# Altium integrated library Cap-General-THP_V2.IntLib: 122 symbols (continued)
## 0.47uF-275VAC-20%-ECQU2A474ML
designator C?, comment value 0.47uF  Voltage: 275VAC  (hidden comment: ECQU2A474ML)
Cap Metallized Polypropylene - Interference Suppressor; Manufacturer: Panasonic; Tol: 20%; Part Number: ECQU2A474ML; Package: POLY-26.5x8.5x17.5-22.5P-BL; EDM-PN: *; Text2: *; Text1: *
footprint POLY-26.5x8.5x17.5-22.5P-BL (Cap- Poly 26.5x8.5mm 22.5 Pitch)
pins: 1, 2

## 0.047uF-275VAC-20%-PHE820MB5470MR17
designator C?, comment value 0.047uF  Voltage: 275VAC  (hidden comment: PHE820MB5470MR17)
Cap Metallized Polyester; Manufacturer: Kemet; Tol: 20%; Part Number: PHE820MB5470MR17; Package: Poly-18x6.5x12.5-15P-BLUE; EDM-PN: *; Text2: *; Text1: *
footprint Poly-18x6.5x12.5-15P-BLUE (Cap Poly  18x6.5-12.5mm 15mm Pitch)
pins: 1, 2

## 0.47uF-310V-10%-0.47 310/275 18.0 16.0 10.0 15.0 0.8
designator C?, comment value 0.47uF  Voltage: 310V  (hidden comment: 0.47 310/275 18.0 16.0 10.0 15.0 0.8)
Cap Metallized Polypropylene - X2; Manufacturer: Jenn Fu; Tol: 10%; Part Number: 0.47 310/275 18.0 16.0 10.0 15.0 0.8; Package: Poly-18x10x16-15P-YEL; EDM-PN: *; Text2: *; Text1: *
footprint Poly-18x10x16-15P-YEL (Cap Poly  18x10mm 15mm Pitch)
pins: 1, 2

## 0.47uF-310V-10%-0.47 310/275 18.0 16.0 10.0 15.0 0.8-Rt-SMD-05
designator C?, comment value 0.47uF  Voltage: 310V  (hidden comment: 0.47 310/275 18.0 16.0 10.0 15.0 0.8)
Cap Metallized Polypropylene - X2; Manufacturer: Jenn Fu; Tol: 10%; Part Number: 0.47 310/275 18.0 16.0 10.0 15.0 0.8; Package: Poly-18x10x16-15P-YEL-RT-05; EDM-PN: *; Text2: *; Text1: *
footprint Poly-18x10x16-15P-YEL-RT-05 (Cap Poly  18x10-16mm 15mm Pitch)
pins: 1, 2

## 0.47uF-310V-10%-890334025039CS
designator C?, comment value 0.47uF  Voltage: 310V  (hidden comment: 890334025039CS)
Cap Metallized Polypropylene - X2; Manufacturer: Wurth; Tol: 10%; Part Number: 890334025039CS; Package: Poly-18x8x15-15P-RED-WE; EDM-PN: *; Text2: *; Text1: *
footprint Poly-18x8x15-15P-RED-WE (Cap Poly  18x5-15mm 15mm Pitch)
pins: 1, 2

## 0.47uF-310V-10%-890334025039CS-Rt-SMD-05
designator C?, comment value 0.47uF  Voltage: 310V  (hidden comment: 890334025039CS)
Cap Metallized Polypropylene - X2; Manufacturer: Wurth; Tol: 10%; Part Number: 890334025039CS; Package: Poly-18x8x15-15P-RED-WE-RT-05; EDM-PN: *; Text2: *; Text1: *
footprint Poly-18x8x15-15P-RED-WE-RT-05 (Cap Poly  18x5-15mm 15mm Pitch)
pins: 1, 2

## 0.47uF-310V-10%-MPX474KF1
designator C?, comment value 0.47uF  Voltage: 310V  (hidden comment: MPX474KF1)
Cap Metallized Polypropylene - X2; Manufacturer: Jenn-Fu; Tol: 10%; Part Number: MPX474KF1; Package: Poly-31.5x11x21-27.5P-Yell; EDM-PN: *; Text2: *; Text1: *
footprint Poly-31.5x11x21-27.5P-Yell (Cap - Poly  31.5x11.0mm)
pins: 1, 2

## 0.47uF-310V-10%-MPX474KF1-Rt
designator C?, comment value 0.47uF  Voltage: 310V  (hidden comment: MPX474KF1)
Cap Metallized Polypropylene - X2; Manufacturer: Jenn-Fu; Tol: 10%; Part Number: MPX474KF1; Package: Poly-31.5x11x21-27.5P-Yell-RT; EDM-PN: *; Text2: *; Text1: *
footprint Poly-31.5x11x21-27.5P-Yell-RT (Cap - Poly  31.5x11.0mm)
pins: 1, 2

## 0.47uF-310V-10%-MPX474KF1-Rt-SMD-3
designator C?, comment value 0.47uF  Voltage: 310V  (hidden comment: MPX474KF1)
Cap Metallized Polypropylene - X2; Manufacturer: Jenn-Fu; Tol: 10%; Part Number: MPX474KF1; Package: Poly-31.5x11x21-27.5P-Yell-RT-SMD-3; EDM-PN: *; Text2: *; Text1: *
footprint Poly-31.5x11x21-27.5P-Yell-RT-SMD-3 (Cap - Poly  31.5x11.0mm)
pins: 1, 2

## 0.47uF-310V-10%-MPX474KF1-Rt-SMD-05
designator C?, comment value 0.47uF  Voltage: 310V  (hidden comment: MPX474KF1)
Cap Metallized Polypropylene - X2; Manufacturer: Jenn-Fu; Tol: 10%; Part Number: MPX474KF1; Package: Poly-31.5x11x21-27.5P-Yell-RT-SMD-05; EDM-PN: *; Text2: *; Text1: *
footprint Poly-31.5x11x21-27.5P-Yell-RT-SMD-05 (Cap - Poly  31.5x11.0mm)
pins: 1, 2

## 0.047uF-630V-10%-MKS2J024701K00
designator C?, comment value 0.047uF  Voltage: 630V  (hidden comment: MKS2J024701K00)
Cap Metallized Polyester; Manufacturer: Wima; Tol: 10%; Part Number: MKS2J024701K00; Package: MKS2-8.5x7.2x14-5; EDM-PN: *; Text2: *; Text1: *
footprint MKS2-8.5x7.2x14-5 (MKS2 8.5x7.2mm 14mm PCM 5.0)
pins: 1, 2

## 0.047uF-630V-10%-MKS2J024701K00-RT
designator C?, comment value 0.047uF  Voltage: 630V  (hidden comment: MKS2J024701K00)
Cap Metallized Polyester; Manufacturer: Wima; Tol: 10%; Part Number: MKS2J024701K00; Package: MKS2-8.5x7.2x14-5-RT; EDM-PN: *; Text2: *; Text1: *
footprint MKS2-8.5x7.2x14-5-RT (MKS2 8.5x7.2mm 14mm PCM 5.0)
pins: 1, 2

## 0.47uF-630V-10%-TS02 00 2J474KSA0IVF
designator C?, comment value 0.47uF  Voltage: 630V  (hidden comment: TS02 00 2J474KSA0IVF)
Cap Metallized Polyester; Manufacturer: Suntan; Tol: 10%; Part Number: TS02 00 2J474KSA0IVF; Package: TS02-31x8x15.5-27.5P; EDM-PN: *; Text2: *; Text1: *
footprint TS02-31x8x15.5-27.5P (TS02 31x8x15.5mm 27.5P)
pins: 1, 2

## 0.47uF-630V-10%-TS02 00 2J474KSA0IVF-DNF
designator C?, comment value (0.47uF)  Voltage: 630V  (hidden comment: TS02 00 2J474KSA0IVF)
Cap Metallized Polyester - Do not Fit; Manufacturer: Suntan; Part Number: DNF - TS02 00 2J474KSA0IVF; Tol: 10%; Package: TS02-31x8x15.5-27.5P; EDM-PN: *; Text2: *; Text1: *
footprint TS02-31x8x15.5-27.5P (TS02 31x8x15.5mm 27.5P)
pins: 1, 2

## 0.47uF-630V-10%-TS02 00 2J474KSA0IVF-DNF-Rt
designator C?, comment value (0.47uF)  Voltage: 630V  (hidden comment: TS02 00 2J474KSA0IVF)
Cap Metallized Polyester - Do not Fit; Manufacturer: Suntan; Part Number: DNF - TS02 00 2J474KSA0IVF; Tol: 10%; Package: TS02-31x8x15.5-27.5P-Rt; EDM-PN: *; Text2: *; Text1: *
footprint TS02-31x8x15.5-27.5P-Rt (TS02 31x8x15.5mm 27.5P)
pins: 1, 2

## 0.47uF-630V-10%-TS02 00 2J474KSA0IVF-Rt
designator C?, comment value 0.47uF  Voltage: 630V  (hidden comment: TS02 00 2J474KSA0IVF)
Cap Metallized Polyester; Manufacturer: Suntan; Tol: 10%; Part Number: TS02 00 2J474KSA0IVF; Package: TS02-31x8x15.5-27.5P-Rt; EDM-PN: *; Text2: *; Text1: *
footprint TS02-31x8x15.5-27.5P-Rt (TS02 31x8x15.5mm 27.5P)
pins: 1, 2

## 0.056uF-400V-5%-ECQE4563JF
designator C?, comment value 0.056uF  Voltage: 400V  (hidden comment: ECQE4563JF)
Cap Metallized Polyester; Manufacturer: Panasonic; Tol: 5%; Part Number: ECQE4563JF; Package: ECQE-12.5x5.0-10.0-10P; EDM-PN: *; Text2: *; Text1: *
footprint ECQE-12.5x5.0-10.0-10P (Cap Poly 12.5x5.0-10mm 10mm Pitch)
pins: 1, 2

## 0.68uF-275VAC-20%-ECQU2A684ML
designator C?, comment value 0.68uF  Voltage: 275VAC  (hidden comment: ECQU2A684ML)
Cap Metallized Polypropylene - Interference Suppressor; Manufacturer: Panasonic; Tol: 20%; Part Number: ECQU2A684ML; Package: POLY-26.5x10.0x19.5-22.5P-BL; EDM-PN: *; Text2: *; Text1: *
footprint POLY-26.5x10.0x19.5-22.5P-BL (Cap- Poly 26.5x10.0mm 22.5 Pitch)
pins: 1, 2

## 0.180uF_63V_5%_B32529C184J289
designator C?, comment value 0.180uF  Voltage: 63V  Text1: B32529  (hidden comment: B32529C184J289)
Cap Polyester; Manufacturer: Epcos; Tol: 5%; Part Number: B32529C184J289; Package: Poly 7.2x2.5-5; EDM-PN: *; Text2: *
footprint MKT-2.5x7.2x6.5-5 (MKT 2.5x7.2mm 6.5mm PCM 5.0)
pins: 1, 2

## 0.180uF_63V_10%_BFC237011184
designator C?, comment value 0.180uF  Voltage: 63V  Text1: MKT370  (hidden comment: BFC237011184)
Cap DC Film; Manufacturer: Vishay; Tol: 10%; Part Number: BFC237011184; Package: Poly 7.2x2.5-5; EDM-PN: *; Text2: *
footprint Poly 7.2x2.5-5 (Cap Poly  7.2x2.5x6.5mm)
pins: 1, 2

## 1.5uF-275V-10%-MKP1.5UFK275VAC-P275
designator C?, comment value 1.5uF  Voltage: 275V  (hidden comment: MKP1.5UFK275VAC-P275)
Cap Metallized Polypropylene - X2; Manufacturer: Jimson; Tol: 10%; Part Number: MKP1.5UFK275VAC-P275; Package: Poly-31.5x15x30-27.5P-YELL; EDM-PN: *; Text2: *; Text1: *
footprint Poly-31.5x15x30-27.5P-YELL (Cap - Poly  31.5x15.0mm)
pins: 1, 2

## 1uF-63V-10%-MKS2C041001F00KSSD
designator C?, comment value 1.0uF  Voltage: 63V  (hidden comment: MKS2C041001F00KSSD)
Cap Metallized Polyester; Manufacturer: Wima; Tol: 10%; Part Number: MKS2C041001F00KSSD; Package: MKS2-5.0x7.2x10.0-5; EDM-PN: *; Text2: *; Text1: *
footprint MKS2-5.0x7.2x10.0-5 (MKS2 5.2x7.2mm 10.0mm PCM 5.0)
pins: 1, 2

## 1uF-63V-20%-MKS2C041001F00MI00
designator C?, comment value 1.0uF  Voltage: 63V  (hidden comment: MKS2C041001F00MI00)
Cap Metallized Polyester; Manufacturer: Wima; Tol: 20%; Part Number: MKS2C041001F00MI00; Package: MKS2-5.0x7.2x10.0-5; EDM-PN: *; Text2: *; Text1: *
footprint MKS2-5.0x7.2x10.0-5 (MKS2 5.2x7.2mm 10.0mm PCM 5.0)
pins: 1, 2

## 1uF-250V-10%-MKP4-1.0/250/10
designator C?, comment value 1uF  Voltage: 250V  (hidden comment: MKP4-1.0/250/10)
Cap Metallized Polypropylene; Manufacturer: Wima; Tol: 10%; Part Number: MKP4-1.0/250/10; Package: MKP4-26.5x7.0x16.5mm 22.5mm; EDM-PN: *; Text2: *; Text1: *
footprint MKP4-26.5x7.0x16.5mm 22.5mm (MKP10-26.5x7.0x16.5mm)
pins: 1, 2

## 1uF-400V-10%-B32653A4105K000
designator C?, comment value 1uF  Voltage: 400V  (hidden comment: B32653A4105K000)
Cap Metallized Polypropylene; Manufacturer: Epcos; Tol: 10%; Reutech PN: 5910-PP-0030; Part Number: B32653A4105K000; Package: POLY-26.5x11.0x21.0-22.5P-BL; EDM-PN: *; Text2: *; Text1: *
footprint POLY-26.5x11.0x21.0-22.5P-BL (Cap- Poly 26.5x11.0mm 22.5 Pitch)
pins: 1, 2

## 1uF-400V-20%-730P105X9400
designator C?, comment value 1uF  Voltage: 400V  (hidden comment: V-730P105X9400)
Cap Metallized Polypropylene; Manufacturer: Vishay; Tol: 20%; Part Number: V-730P105X9400; Package: Poly-31.8x16.6-AX; EDM-PN: *; Text2: *; Text1: *
footprint POLY-31.8X16.6-AX (Poly 31.8x16.6mm Axial)
pins: 1, 2

## 2.2uF-100V-20%-2.2uF 100V MEF 20%-Opt2
designator C?, comment value 2.2uF  Voltage: 100V  (hidden comment: 2.2uF 100V MEF 20%)
Cap Metallized Polyester; Manufacturer: Jimson; Part Number: 2.2uF 100V MEF 20%; Package: POLY-24.0x13.0x21.0-20P+2P; EDM-PN: *; Text2: *; Tol: 20%; Text1: *
footprint POLY-24.0x13.0x21.0-20P+2P (Cap- Poly 24.0x13.0mm 20 Pitch)
pins: 1, 2

## 2.2uF-100V-20%-ECQ-E1225RKF
designator C?, comment value 2.2uF  Voltage: 100V  (hidden comment: ECQ-E1225RKF)
Cap Metallized Polyester; Manufacturer: Panasonic; Tol: 20%; Part Number: ECQ-E1225RKF; Package: Poly-18.5x7x20-15P; EDM-PN: *; Text2: *; Text1: *
footprint Poly-18.5x7x20-15P (Cap Poly  18.5x7-20mm 15mm Pitch)
pins: 1, 2

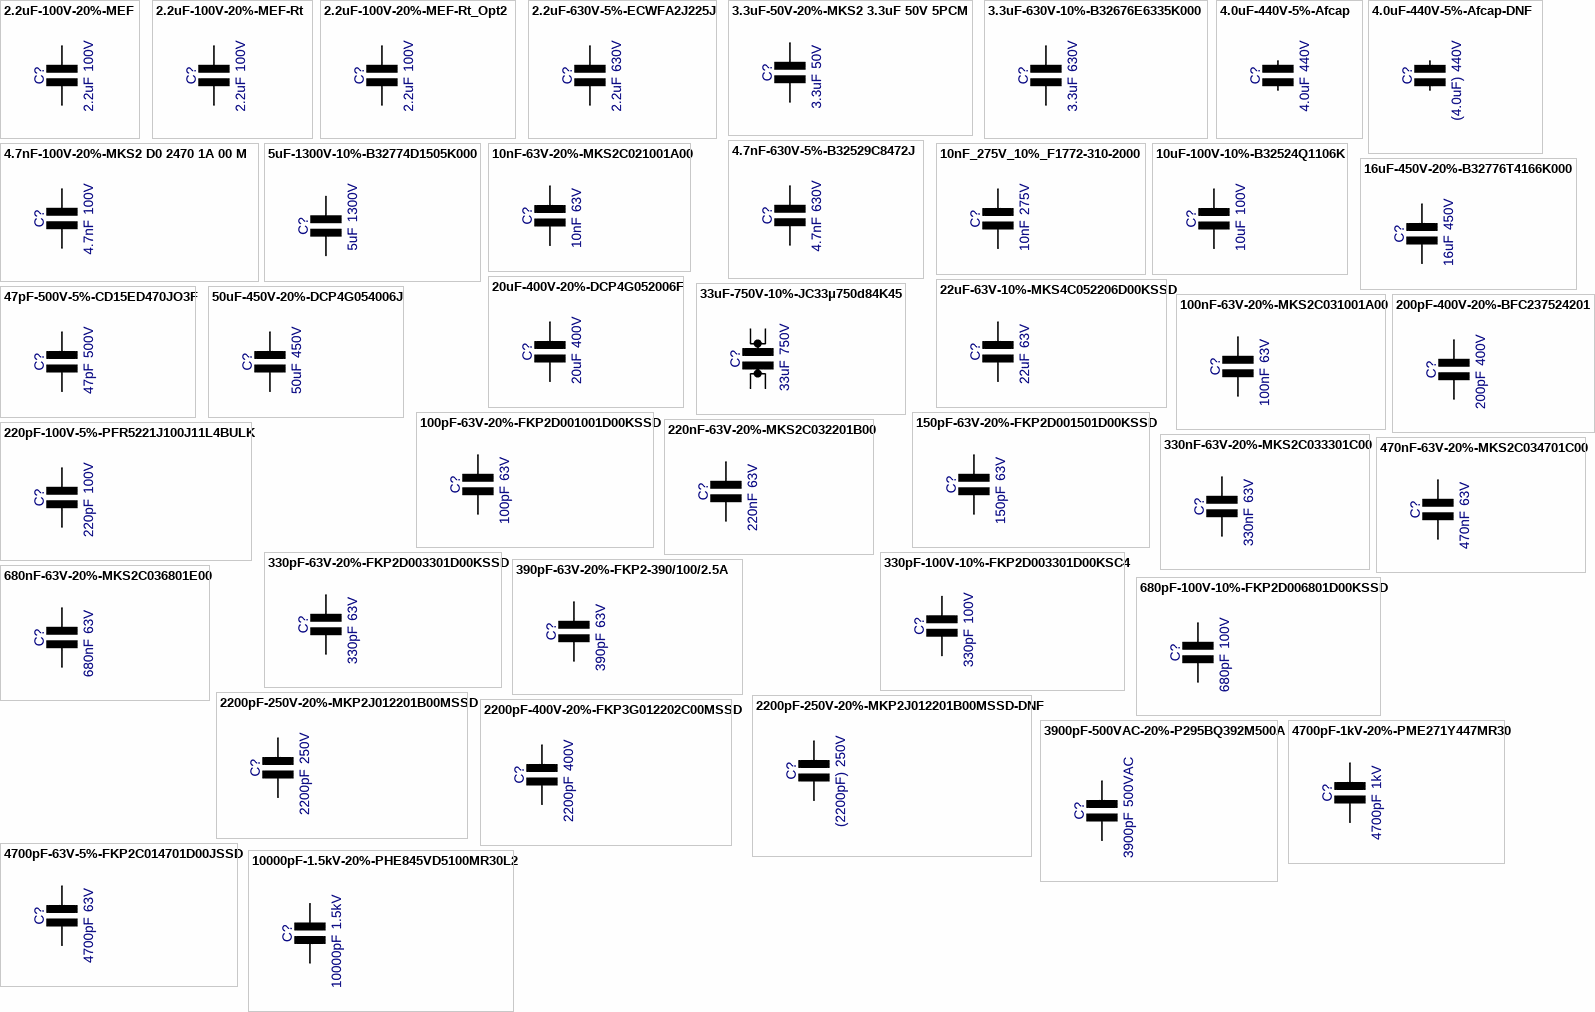
[diagram p2: symbols 2.2uF-100V-20%-MEF to 10000pF-1.5kV-20%-PHE845VD5100MR30L2]

## 2.2uF-100V-20%-MEF
designator C?, comment value 2.2uF  Voltage: 100V  (hidden comment: 2.2uF 100V MEF 20%)
Cap Metallized Polyester; Manufacturer: Jimson; Part Number: 2.2uF 100V MEF 20%; Package: POLY-24.0x13.0x21.0-20P; EDM-PN: *; Text2: *; Tol: 20%; Text1: *
footprint POLY-24.0x13.0x21.0-20P (Cap- Poly 24.0x13.0mm 20 Pitch)
pins: 1, 2

## 2.2uF-100V-20%-MEF-Rt
designator C?, comment value 2.2uF  Voltage: 100V  (hidden comment: 2.2uF-100V-V-MEF)
Cap Metallized Polyester; Manufacturer: Jimson; Part Number: 2.2uF 100V MEF 20%; Tol: 20%; Package: POLY-24.0x13.0x21.0-20P-RT; EDM-PN: *; Text2: *; Text1: *
footprint POLY-24.0x13.0x21.0-20P-RT (Cap- Poly 24.0x13.0mm 20 Pitch)
pins: 1, 2

## 2.2uF-100V-20%-MEF-Rt_Opt2
designator C?, comment value 2.2uF  Voltage: 100V  (hidden comment: 2.2uF-100V-V-MEF)
Cap Metallized Polyester; Manufacturer: Jimson; Part Number: 2.2uF 100V MEF 20%; Tol: 20%; Package: POLY-24.0x13.0x21.0-20P-RT+2P; EDM-PN: *; Text2: *; Text1: *
footprint POLY-24.0x13.0x21.0-20P-RT+2P (Cap- Poly 24.0x13.0mm 20 Pitch)
pins: 1, 2

## 2.2uF-630V-5%-ECWFA2J225J
designator C?, comment value 2.2uF  Voltage: 630V  (hidden comment: ECWFA2J225J)
Cap Metallized Polypropylene; Manufacturer: Panasonic; Tol: 5%; Part Number: ECWFA2J225J; Package: Poly-26x16.3x21.4 22.5p; EDM-PN: *; Text2: *; Text1: *
footprint POLY-26.5x16.3x22.9mm 22.5P (POLY-26.5x16.3x22.9mm 22.5mm)
pins: 1, 2

## 3.3uF-50V-20%-MKS2 3.3uF 50V 5PCM
designator C?, comment value 3.3uF  Voltage: 50V  (hidden comment: MKS2 3.3uF 50V 5PCM)
Cap Metallized Polyester; Manufacturer: Wima; Tol: 20%; Part Number: MKS2 3.3uF 50V 5PCM; Package: MKS2-7.2x7.2x13-5; EDM-PN: *; Text2: *; Text1: *
footprint MKS2-7.2x7.2x13-5 (MKS2 7.2x7.2mm 13mm PCM 5.0)
pins: 1, 2

## 3.3uF-630V-10%-B32676E6335K000
designator C?, comment value 3.3uF  Voltage: 630V  (hidden comment: B32676E6335K000)
Cap Metallized Polypropylene; Manufacturer: Epcos (TDK); Tol: 10%; Part Number: B32676E6335K000; Package: Poly-42.0x16.0-37.5P; EDM-PN: *; Text2: *; Text1: *
footprint Poly-42.0x16.0-37.5P (Cap - Poly  42.0x16.0mm)
pins: 1, 2

## 4.0uF-440V-5%-Afcap
designator C?  value 4.0uF  Voltage: 440V  (hidden comment: 4.0uF-440V-5%-Afcap)
Cap Motor Run Stud Mount; Manufacturer: Afcap; Part Number: 4.0uF 440V 5%; Tol: 5%; Package: CAP-30x55-STUD; EDM-PN: *; Text2: *; Text1: *
footprint CAP-30x55-STUD (CAP 30.0x55.0mm)

## 4.0uF-440V-5%-Afcap-DNF
designator C?, comment value (4.0uF)  Voltage: 440V  (hidden comment: 4.0uF-440V-5%-Afcap)
Cap Motor Run Stud Mount (Do not Fit); Manufacturer: Afcap; Part Number: DNF - 4.0uF 440V 5%; Tol: 5%; Package: CAP-30x55-STUD; EDM-PN: *; Text2: *; Text1: *
footprint CAP-30x55-STUD (CAP 30.0x55.0mm)

## 4.7nF-100V-20%-MKS2 D0 2470 1A 00 M
designator C?, comment value 4.7nF  Voltage: 100V  (hidden comment: MKS2 D0 2470 1A 00 M)
Cap Metallized Polyester; Manufacturer: Wima; Tol: 20%; Part Number: MKS2 D0 2470 1A 00 M; Package: MKS2-2.5x7.2x6.5-5; EDM-PN: *; Text2: *; Text1: *
footprint MKS2-2.5x7.2x6.5-5 (MKS2 2.5x7.2mm 6.5mm PCM 5.0)
pins: 1, 2

## 4.7nF-630V-5%-B32529C8472J
designator C?, comment value 4.7nF  Voltage: 630V  (hidden comment: B32529C8472J)
Cap Metallized Polyester; Manufacturer: Epcos; Tol: 5%; Part Number: B32529C8472J; Package: Poly 7.3x3.5x8.0-5; EDM-PN: *; Text2: *; Text1: *
footprint Poly 7.3x3.5x8.0-5 (Cap Poly  7.3x3.5x8.0mmm)
pins: 1, 2

## 5uF-1300V-10%-B32774D1505K000
designator C?, comment value 5uF  Voltage: 1300V  (hidden comment: B32774D1505K000)
Cap Metallized Polypropylene 1.3kV DC; Manufacturer: TDK; Tol: 10%; Part Number: B32774D1505K000; Package: Poly-31.5x22x36.5-27.5P-BLUE; EDM-PN: *; Text2: *; Text1: *
footprint Poly-31.5x22x36.5-27.5P-BLUE (Cap - Poly  31.5x22.0mm)
pins: 1, 2

## 10nF-63V-20%-MKS2C021001A00
designator C?, comment value 10nF  Voltage: 63V  (hidden comment: MKS2C021001A00)
Cap Metallized Polyester; Manufacturer: Wima; Tol: 20%; Part Number: MKS2C021001A00; Package: MKS2-2.5x7.2x6.5-5; EDM-PN: *; Text2: *; Text1: *
footprint MKS2-2.5x7.2x6.5-5 (MKS2 2.5x7.2mm 6.5mm PCM 5.0)
pins: 1, 2

## 10nF_275V_10%_F1772-310-2000
designator C?, comment value 10nF  Voltage: 275V  (hidden comment: F1772-310-2000)
Capacitor Suppression Class X2; Manufacturer: Vishay; Tol: 10%; Part Number: F1772-310-2000; Package: F1772-310-2000-THP; EDM-PN: *; Text2: *; Text1: *
footprint F1772-310-2000-THP (Suppression Capacitor Class X2)
pins: 1, 2

## 10uF-100V-10%-B32524Q1106K
designator C?, comment value 10uF  Voltage: 100V  (hidden comment: B32524Q1106K)
Cap Metallized Polyester; Manufacturer: Epcos; Tol: 10%; Reutech PN: 5910-PE-0009; Part Number: B32524Q1106K; Package: Poly-31.5x11x21-27.5P; EDM-PN: *; Text2: *; Text1: *
footprint Poly-31.5x11x21-27.5P (Cap - Poly  31.5x11.0mm)
pins: 1, 2

## 16uF-450V-20%-B32776T4166K000
designator C?, comment value 16uF  Voltage: 450V  (hidden comment: B32776T4166K000)
Cap Metallized Polypropylene DC LINK MKP4; Manufacturer: Wima; Tol: 20%; Reutech PN: 5910-PP-0028; Part Number: B32776T4166K000; Package: Poly-41.5x24.0-19.0-37.5P; EDM-PN: *; Text2: *; Text1: *
footprint Poly-41.5x24.0-19.0-37.5P (Cap - Poly  41.5x24.0mm)
pins: 1, 2

## 20uF-400V-20%-DCP4G052006F
designator C?, comment value 20uF  Voltage: 400V  (hidden comment: DCP4G052006F)
Cap Metallized Polypropylene DC LINK MKP4; Manufacturer: Wima; Tol: 20%; Part Number: DCP4G052006F; Package: Poly-31.5x15x26-27.5P-RED; EDM-PN: *; Text2: *; Text1: *; Reutech PN: N/A
footprint Poly-31.5x15x26-27.5P-RED (Cap - Poly  31.5x15.0mm)
pins: 1, 2

## 22uF-63V-10%-MKS4C052206D00KSSD
designator C?, comment value 22uF  Voltage: 63V  (hidden comment: MKS4C052206D00KSSD)
Cap Polyester (PET) Metallized; Manufacturer: Wima; Tol: 10%; Part Number: MKS4C052206D00KSSD; Package: Poly-31.5x13x24-27.5P-RED; EDM-PN: *; Text2: *; Text1: *
footprint Poly-31.5x13x24-27.5P-RED (Cap - Poly  31.5x14.0mm Red)
pins: 1, 2

## 33uF-750V-10%-JC33μ750d84K45
designator C?, comment value 33uF  Voltage: 750V  (hidden comment: JC33μ750d84K45)
Cap Joule Type; Manufacturer: FT Cap; Tol: 10%; Part Number: JC33μ750d84K45; Package: CAP-JC-4Pin-84H; EDM-PN: *; Text2: *; Text1: *
footprint CAP-JC-4Pin-84H (CAP-JC-4Pin-35.5x30.5mm)
pins: 1, 2, 3, 4

## 47pF-500V-5%-CD15ED470JO3F
designator C?, comment value 47pF  Voltage: 500V  (hidden comment: CD15ED470JO3F)
Cap Mica Dipped; Manufacturer: Cornell Dublier; Tol: 5%; Part Number: CD15ED470JO3F; Package: CAP-CD15; EDM-PN: *; Text2: *; Text1: *
footprint CAP-CD15 (CAP-CD15 11.4x4.3mm)
pins: 1, 2

## 50uF-450V-20%-DCP4G054006J
designator C?, comment value 50uF  Voltage: 450V  (hidden comment: DCP4G054006J)
Cap Metallized Polypropylene DC Link, DC Filtering; Manufacturer: Epcos; Tol: 20%; Reutech PN: 5910-PP-0029; Part Number: DCP4G054006J; Package: Poly-41.5x28.0-42.5-37.5P; EDM-PN: *; Text2: *; Text1: *
footprint Poly-41.5x28.0-42.5-37.5P (Cap - Poly  41.5x28.0mm)
pins: 1, 2

## 100nF-63V-20%-MKS2C031001A00
designator C?, comment value 100nF  Voltage: 63V  (hidden comment: MKS2C031001A00)
Cap Metallized Polyester; Manufacturer: Wima; Tol: 20%; Part Number: MKS2C031001A00; Package: MKS2-2.5x7.2x6.5-5; EDM-PN: *; Text2: *; Text1: *
footprint MKS2-2.5x7.2x6.5-5 (MKS2 2.5x7.2mm 6.5mm PCM 5.0)
pins: 1, 2

## 100pF-63V-20%-FKP2D001001D00KSSD
designator C?, comment value 100pF  Voltage: 63V  (hidden comment: FKP2D001001D00KSSD)
Cap Polypropylene; Manufacturer: Wima; Tol: 20%; Part Number: FKP2D001001D00KSSD; Package: Poly 7.2x4.5x6.0-5; EDM-PN: *; Text2: *; Text1: *
footprint Poly 7.2x4.5x6.0-5 (Cap Poly  7.2x4.5x6.0mm 5mm)
pins: 1, 2

## 150pF-63V-20%-FKP2D001501D00KSSD
designator C?, comment value 150pF  Voltage: 63V  (hidden comment: 150pF-63V-V-FKP2)
Cap Polypropylene; Manufacturer: Wima; Part Number: FKP2D001501D00KSSD; Tol: 20%; Package: Poly 7.2x4.5x6.0-5; EDM-PN: *; Text2: *; Text1: *
footprint Poly 7.2x4.5x6.0-5 (Cap Poly  7.2x4.5x6.0mm 5mm)
pins: 1, 2

## 200pF-400V-20%-BFC237524201
designator C?, comment value 200pF  Voltage: 400V  (hidden comment: BFC237524201)
Cap Polypropylene; Manufacturer: Vishay; Tol: 20%; Part Number: BFC237524201; Package: Poly-13.5x5.5-14.5-10P; EDM-PN: *; Text2: *; Text1: *
footprint Poly-13.5x5.5-14.5-10P (Cap Poly  13.5x5.5-14.5mm 10mm Pitch)
pins: 1, 2

## 220nF-63V-20%-MKS2C032201B00
designator C?, comment value 220nF  Voltage: 63V  (hidden comment: MKS2C032201B00)
Cap Metallized Polyester; Manufacturer: Wima; Tol: 20%; Part Number: MKS2C032201B00; Package: MKS2-3.0x7.2x7.5-5; EDM-PN: *; Text2: *; Text1: *
footprint MKS2-3.0x7.2x7.5-5 (MKS2 3.0x7.2mm 7.5mm PCM 5.0)
pins: 1, 2

## 220pF-100V-5%-PFR5221J100J11L4BULK
designator C?, comment value 220pF  Voltage: 100V  (hidden comment: PFR5221J100J11L4BULK)
Cap Polypropylene; Manufacturer: kemet; Tol: 5%; Part Number: PFR5221J100J11L4BULK; Package: Poly 7.2x4.5x6.0-5; EDM-PN: *; Text2: *; Text1: *
footprint Poly 7.2x4.5x6.0-5 (Cap Poly  7.2x4.5x6.0mm 5mm)
pins: 1, 2

## 330nF-63V-20%-MKS2C033301C00
designator C?, comment value 330nF  Voltage: 63V  (hidden comment: MKS2C033301C00)
Cap Metallized Polyester; Manufacturer: Wima; Tol: 20%; Part Number: MKS2C033301C00; Package: MKS2-3.5x7.2x8.5-5; EDM-PN: *; Text2: *; Text1: *
footprint MKS2-3.5x7.2x8.5-5 (MKS2 3.5x7.2mm 8.5mm PCM 5.0)
pins: 1, 2

## 330pF-63V-20%-FKP2D003301D00KSSD
designator C?, comment value 330pF  Voltage: 63V  (hidden comment: FKP2D003301D00KSSD)
Cap Polypropylene; Manufacturer: Wima; Tol: 20%; Part Number: FKP2D003301D00KSSD; Package: Poly 7.2x4.5x6.0-5; EDM-PN: *; Text2: *; Text1: *
footprint Poly 7.2x4.5x6.0-5 (Cap Poly  7.2x4.5x6.0mm 5mm)
pins: 1, 2

## 330pF-100V-10%-FKP2D003301D00KSC4
designator C?, comment value 330pF  Voltage: 100V  (hidden comment: FKP2D003301D00KSC4)
Cap Polypropylene; Manufacturer: Wima; Tol: 10%; Part Number: FKP2D003301D00KSC4; Package: Poly 7.2x4.5x6.0-5; EDM-PN: *; Text2: *; Text1: *
footprint Poly 7.2x4.5x6.0-5 (Cap Poly  7.2x4.5x6.0mm 5mm)
pins: 1, 2

## 390pF-63V-20%-FKP2-390/100/2.5A
designator C?, comment value 390pF  Voltage: 63V  (hidden comment: FKP2-390/100/2.5A)
Cap Polypropylene; Manufacturer: Wima; Tol: 20%; Part Number: FKP2-390/100/2.5A; Package: Poly 7.2x4.5x6.0-5; EDM-PN: *; Text2: *; Text1: *
footprint Poly 7.2x4.5x6.0-5 (Cap Poly  7.2x4.5x6.0mm 5mm)
pins: 1, 2

## 470nF-63V-20%-MKS2C034701C00
designator C?, comment value 470nF  Voltage: 63V  (hidden comment: MKS2C034701C00)
Cap Metallized Polyester; Manufacturer: Wima; Tol: 20%; Part Number: MKS2C034701C00; Package: MKS2-3.5x7.2x8.5-5; EDM-PN: *; Text2: *; Text1: *
footprint MKS2-3.5x7.2x8.5-5 (MKS2 3.5x7.2mm 8.5mm PCM 5.0)
pins: 1, 2

## 680nF-63V-20%-MKS2C036801E00
designator C?, comment value 680nF  Voltage: 63V  (hidden comment: MKS2C036801E00)
Cap Metallized Polyester; Manufacturer: Wima; Tol: 20%; Part Number: MKS2C036801E00; Package: MKS2-4.5x7.2x9.5-5; EDM-PN: *; Text2: *; Text1: *
footprint MKS2-4.5x7.2x9.5-5 (MKS2 4.5x7.2mm 9.5mm PCM 5.0)
pins: 1, 2

## 680pF-100V-10%-FKP2D006801D00KSSD
designator C?, comment value 680pF  Voltage: 100V  (hidden comment: FKP2D006801D00KSSD)
Cap Polypropylene; Manufacturer: Wima; Tol: 10%; Part Number: FKP2D006801D00KSSD; Package: Poly 7.2x4.5x6.0-5; EDM-PN: *; Text2: *; Text1: *
footprint Poly 7.2x4.5x6.0-5 (Cap Poly  7.2x4.5x6.0mm 5mm)
pins: 1, 2

## 2200pF-250V-20%-MKP2J012201B00MSSD
designator C?, comment value 2200pF  Voltage: 250V  (hidden comment: MKP2J012201B00MSSD)
Cap Metallized Polyester 250VAC/630VDC; Manufacturer: Wima; Tol: 20%; Part Number: MKP2J012201B00MSSD; Package: MKS2-3.0x7.2x7.5-5; EDM-PN: *; Text2: *; Text1: *
footprint MKS2-3.0x7.2x7.5-5 (MKS2 3.0x7.2mm 7.5mm PCM 5.0)
pins: 1, 2

## 2200pF-250V-20%-MKP2J012201B00MSSD-DNF
designator C?, comment value (2200pF)  Voltage: 250V  (hidden comment: MKP2J012201B00MSSD)
Cap Metallized Polyester 250VAC/630VDC - Do not Fit; Manufacturer: Wima; Part Number: DNF - MKP2J012201B00MSSD; Tol: 20%; Package: MKS2-3.0x7.2x7.5-5; EDM-PN: *; Text2: *; Text1: *
footprint MKS2-3.0x7.2x7.5-5 (MKS2 3.0x7.2mm 7.5mm PCM 5.0)
pins: 1, 2

## 2200pF-400V-20%-FKP3G012202C00MSSD
designator C?, comment value 2200pF  Voltage: 400V  (hidden comment: FKP3G012202C00MSSD)
Cap Polypropylene Film; Manufacturer: Wima; Tol: 20%; Part Number: FKP3G012202C00MSSD; Package: Poly-10.0x4.0-9.0-7.5P; EDM-PN: *; Text2: *; Text1: *
footprint Poly-10.0x4.0-9.0-7.5P (Cap Poly  10.0x4.0-9.0mm 7.5mm Pitch)
pins: 1, 2

## 3900pF-500VAC-20%-P295BQ392M500A
designator C?, comment value 3900pF  Voltage: 500VAC  (hidden comment: P295BQ392M500A)
Cap Metallized Film; Manufacturer: Kemet; Tol: 20%; Part Number: P295BQ392M500A; Package: Poly-18x8.5x16-15P; EDM-PN: *; Text2: *; Text1: *
footprint Poly-18x8.5x16-15P (Cap Poly  18x8.5-16mm 15mm Pitch)
pins: 1, 2

## 4700pF-1kV-20%-PME271Y447MR30
designator C?, comment value 4700pF  Voltage: 1kV  (hidden comment: PME271Y447MR30)
Cap Metallized Film; Manufacturer: Kemet; Tol: 20%; Part Number: PME271Y447MR30; Package: Poly-13.5x5.1-10.5-10.2P; EDM-PN: *; Text2: *; Text1: *
footprint Poly-13.5x5.1-10.5-10.2P (Cap Poly  13.5x5.1-10.5mm 10.2mm Pitch)
pins: 1, 2

## 4700pF-63V-5%-FKP2C014701D00JSSD
designator C?, comment value 4700pF  Voltage: 63V  (hidden comment: FKP2C014701D00JSSD)
Cap Polypropylene; Manufacturer: Wima; Tol: 5%; Part Number: FKP2C014701D00JSSD; Package: Poly 7.2x4.5x6.0-5; EDM-PN: *; Text2: *; Text1: *
footprint Poly 7.2x4.5x6.0-5 (Cap Poly  7.2x4.5x6.0mm 5mm)
pins: 1, 2

## 10000pF-1.5kV-20%-PHE845VD5100MR30L2
designator C?, comment value 10000pF  Voltage: 1.5kV  (hidden comment: PHE845VD5100MR30L2)
Cap Metallized Polypropylene Class X1 760 VAC; Manufacturer: Kemet; Tol: 20%; Part Number: PHE845VD5100MR30L2; Package: POLY-26.0x6.5x14.5-22.5P-Blue; EDM-PN: *; Text2: *; Text1: *
footprint POLY-26.0x6.5x14.5-22.5P-Blue (Cap- Poly 26.0x6.5mm 22.5 Pitch)
pins: 1, 2

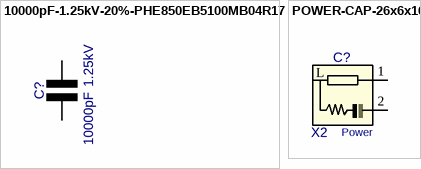
[diagram p3: symbols 10000pF-1.25kV-20%-PHE850EB5100MB04R17 to POWER-CAP-26x6x16]

## 10000pF-1.25kV-20%-PHE850EB5100MB04R17
designator C?, comment value 10000pF  Voltage: 1.25kV  (hidden comment: PHE850EB5100MB04R17)
Cap Metallized Polypropylene Class Y2 1.25kV; Manufacturer: Kemet; Tol: 20%; Part Number: PHE850EB5100MB04R17; Package: Poly-18x5.5x10.5-15P; EDM-PN: *; Text2: *; Text1: *
footprint Poly-18x5.5x10.5-15P (Cap Poly  18x55.5-10.5mm 15mm Pitch)
pins: 1, 2

## POWER-CAP-26x6x16
designator C?  value X2  Text1: Power  (hidden comment: POWER-CAP-26x6x16)
Cap Power X2; Manufacturer: Owner; Part Number: NA; Tol: ?%; Package: POWER-CAP-26x6x16-20; EDM-PN: *; Text2: *; Voltage: *
footprint POWER-CAP-26x6x16-20 (POWER-CAP 26x6x16mm 20mm Pitch)
pins: 1, 2
text: L